# Altium footprint library CADTlink.PcbLib: 143 footprints (part 9 of 9)
Each footprint in its own frame and in the unit in brackets; x right, y up, seen from the top. Pads: shape width x height; smd on the part's side, far side on the other; paste and mask are expansions set on the pad; w line width, h text height; cw(c..) or ccw(c..) is an arc to the next point about the centre after c.
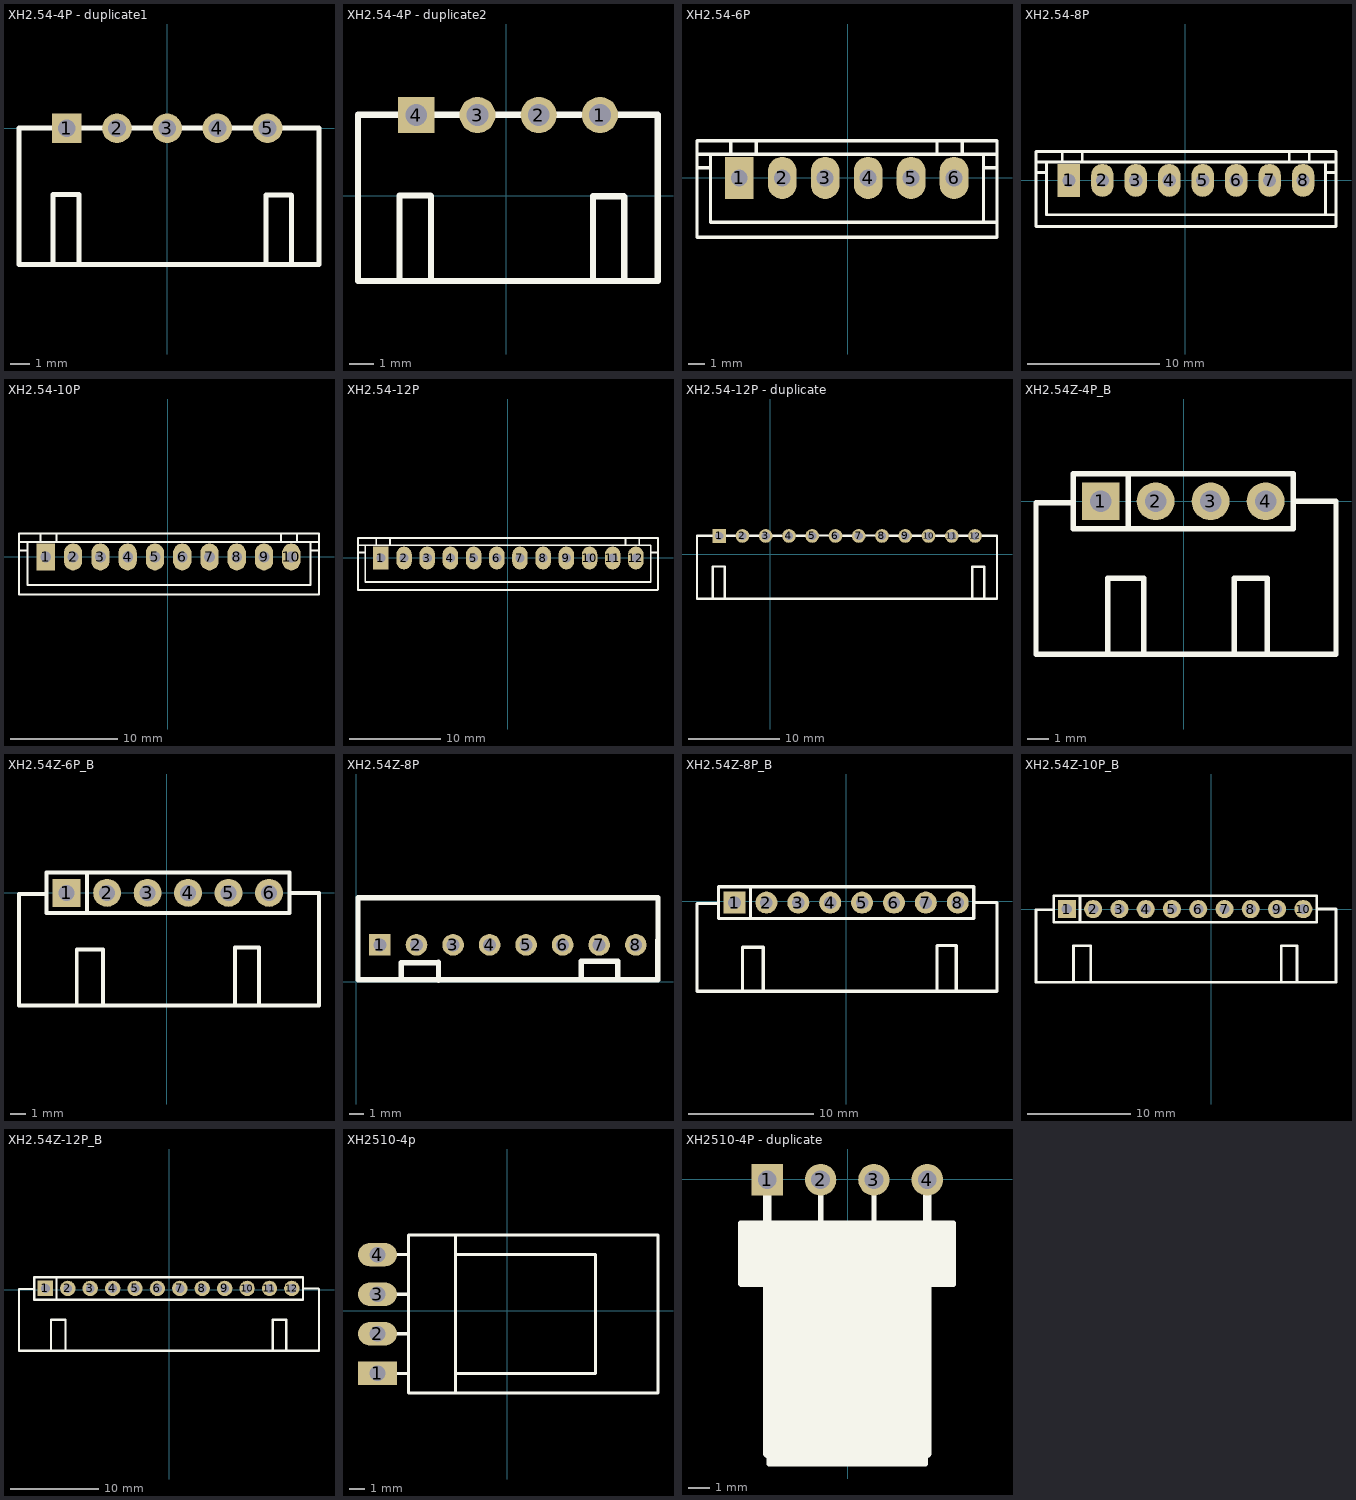
[diagram p8: the footprints below, top view; thin cyan lines are the x and y axes]

## XH2.54-4P - duplicate1 [mm]
pads (5):
  rect 1.5x1.5 hole 0.9: 1(-5.08,0)
  round 1.5 hole 0.9: 2(-2.54,0) 3(0,0) 4(2.54,0) 5(5.08,0)
Top Overlay:
  lines w0.254: -7.5,-6.88 4.993,-6.88 ; -7.492,-6.886 -7.492,0 ; -7.492,0.01 -5.778,0.01 1.732,0.01 5.915,0.01 7.683,0.01 ; -5.77,-6.81 -5.77,-3.34 -4.49,-3.34 -4.47,-3.36 -4.47,-6.75 ; 6.293,-6.78 6.293,-3.39 6.273,-3.37 4.993,-3.37 4.993,-6.88 ; 7.683,0 7.683,-6.889 4.993,-6.88
3D body: height 7, standoff -3.4, extent -7.362,-6.106 7.667,-0.356

## XH2.54-4P - duplicate2 [mm]
pads (4):
  round 1.5 hole 0.9: 1(3.892,3.353) 2(1.352,3.353) 3(-1.188,3.353)
  rect 1.5x1.5 hole 0.9: 4(-3.728,3.353)
Top Overlay:
  lines w0.254: -6.148,-3.527 6.302,-3.527 ; -6.14,-3.533 -6.14,3.353 ; -6.14,3.363 -4.426,3.363 ; -4.418,-3.457 -4.418,0.013 -3.138,0.013 -3.118,-0.007 -3.118,-3.397 ; -3.026,3.363 3.084,3.363 ; 3.602,-3.487 3.602,-0.017 4.882,-0.017 4.902,-0.037 4.902,-3.427 ; 4.524,3.363 6.292,3.363 ; 6.292,-3.536 6.292,3.353
3D body: height 8, standoff -2, extent -6.072,-2.805 6.428,2.845

## XH2.54-6P [mm]
pads (6):
  rect 1.7x2.5 hole 1 square: 1(-6.405,0)
  oval 1.7x2.5 hole 1: 2(-3.865,0) 3(-1.325,0) 4(1.215,0) 5(3.755,0) 6(6.295,0)
Top Overlay:
  lines w0.2: -8.905,0.595 -8.105,0.595 ; -8.905,1.395 8.835,1.395 ; -8.105,1.395 -8.105,-2.616 8.834,-2.616 ; -6.905,1.395 -6.905,2.184 ; -5.405,1.42 -5.405,2.184 ; 5.289,1.42 5.289,2.184 ; 6.789,1.395 6.789,2.184 ; 8.034,-2.616 8.034,1.395 ; 8.034,0.595 8.834,0.595 ; 8.834,-3.505 -8.905,-3.505 -8.905,2.195 8.819,2.195 8.819,2.159 8.834,2.159 8.834,-3.47

## XH2.54-8P [mm]
pads (8):
  rect 1.7x2.5 hole 1 square: 1(-8.85,0)
  oval 1.7x2.5 hole 1: 2(-6.31,0) 3(-3.77,0) 4(-1.23,0) 5(1.31,0) 6(3.85,0) 7(6.39,0) 8(8.93,0)
Top Overlay:
  lines w0.2: -11.35,0.595 -10.55,0.595 ; -11.35,1.395 11.429,1.395 ; -10.55,1.395 -10.55,-2.616 11.429,-2.616 ; -9.35,1.395 -9.35,2.184 ; -7.85,1.42 -7.85,2.184 ; 7.884,1.42 7.884,2.184 ; 9.384,1.395 9.384,2.184 ; 10.629,-2.616 10.629,1.395 ; 10.629,0.595 11.429,0.595 ; 11.415,2.195 11.415,2.159 11.429,2.159 11.429,-3.47 ; 11.429,-3.505 -11.35,-3.505 -11.35,2.195 11.429,2.195

## XH2.54-10P [mm]
pads (10):
  rect 1.7x2.5 hole 1 square: 1(-11.37,0)
  oval 1.7x2.5 hole 1: 2(-8.83,0) 3(-6.29,0) 4(-3.75,0) 5(-1.21,0) 6(1.33,0) 7(3.87,0) 8(6.41,0) 9(8.95,0) 10(11.49,0)
Top Overlay:
  lines w0.2: -13.87,0.595 -13.07,0.595 ; -13.87,1.395 14.07,1.395 ; -13.07,1.395 -13.07,-2.616 13.27,-2.616 13.27,1.395 ; -11.87,1.395 -11.87,2.184 ; -10.37,1.42 -10.37,2.184 ; 10.525,1.42 10.525,2.184 ; 12.025,1.395 12.025,2.184 ; 13.27,0.595 14.07,0.595 ; 14.035,-3.505 -13.87,-3.505 -13.87,2.195 14.055,2.195 14.055,2.159 14.07,2.159 14.07,-3.47

## XH2.54-12P [mm]
pads (12):
  rect 1.7x2.5 hole 1 square: 1(-13.915,-0.051)
  oval 1.7x2.5 hole 1: 2(-11.375,-0.051) 3(-8.835,-0.051) 4(-6.295,-0.051) 5(-3.755,-0.051) 6(-1.215,-0.051) 7(1.325,-0.051) 8(3.865,-0.051) 9(6.405,-0.051) 10(8.945,-0.051) 11(11.485,-0.051) 12(14.025,-0.051)
Top Overlay:
  lines w0.2: -16.415,0.544 -15.615,0.544 ; -16.415,1.344 15.63,1.344 ; -15.615,1.344 -15.615,-2.667 15.645,-2.667 15.645,1.344 ; -14.415,1.344 -14.415,2.134 ; -12.915,1.369 -12.915,2.134 ; 12.9,1.369 12.9,2.134 ; 14.4,1.344 14.4,2.134 ; 15.645,0.544 16.445,0.544 ; 16.44,2.144 -16.415,2.144 -16.415,-3.556 16.41,-3.556 16.445,-3.521 16.445,2.144

## XH2.54-12P - duplicate [mm]
pads (12):
  rect 1.5x1.5 hole 0.9: 1(-5.557,1.981)
  round 1.5 hole 0.9: 2(-3.017,1.981) 3(-0.477,1.981) 4(2.063,1.981) 5(4.603,1.981) 6(7.143,1.981) 7(9.683,1.981) 8(12.223,1.981) 9(14.763,1.981) 10(17.303,1.981) 11(19.843,1.981) 12(22.383,1.981)
Top Overlay:
  lines w0.254: -7.977,-4.899 24.765,-4.899 ; -7.969,-4.905 -7.969,1.981 ; -7.969,1.991 -6.255,1.991 ; -6.247,-4.829 -6.247,-1.359 -4.967,-1.359 -4.947,-1.379 -4.947,-4.769 ; -4.855,1.991 1.255,1.991 ; 2.695,1.991 4.463,1.991 ; 5.083,2.017 6.851,2.017 ; 7.775,1.991 9.543,1.991 ; 10.239,2.017 12.007,2.017 ; 12.855,1.991 14.623,1.991 ; 15.395,1.991 17.163,1.991 ; 17.935,1.991 19.703,1.991 ; 20.298,1.991 22.065,1.991 ; 22.093,-4.859 22.093,-1.389 23.373,-1.389 23.393,-1.409 23.393,-4.799 ; 23.015,1.991 24.783,1.991 ; 24.783,-4.907 24.783,1.981
3D body: height 5.67, standoff -3.08, extent -7.884,-5.298 24.716,2.402

## XH2.54Z-4P_B [mm]
pads (4):
  rect 1.75x1.75 hole 1: 1(-3.837,0)
  round 1.75 hole 1: 2(-1.297,0) 3(1.243,0) 4(3.783,0)
Top Overlay:
  lines w0.25: -6.826,-0.064 -5.171,-0.064 ; -3.502,-7.064 -3.502,-3.556 -1.851,-3.556 -1.851,-6.937 ; 2.339,-7.064 2.339,-3.556 3.863,-3.556 3.863,-7.064 ; 5.07,0 7.035,0
  lines w0.254: -6.826,-0.064 -6.826,-7.064 7.035,-7.064 7.035,0 ; -2.567,-1.27 -2.567,1.27 ; -5.107,-1.27 -5.107,1.27 5.07,1.27 5.07,-1.27 -5.107,-1.27
3D body: height 5.76, standoff -2.79, extent -6.225,-7.192 6.275,0.508

## XH2.54Z-6P_B [mm]
pads (6):
  rect 1.75x1.75 hole 1: 1(-6.297,0)
  round 1.75 hole 1: 2(-3.757,0) 3(-1.217,0) 4(1.323,0) 5(3.863,0) 6(6.403,0)
Top Overlay:
  lines w0.25: -9.286,-0.064 -7.631,-0.064 ; -5.662,-7.064 -5.662,-3.556 -4.011,-3.556 -4.011,-6.937 ; 4.259,-6.937 4.259,-3.429 5.783,-3.429 5.783,-6.937 ; 7.71,0 9.54,0
  lines w0.254: -9.286,-0.064 -9.286,-7.064 9.54,-7.064 9.54,0 ; -5.027,-1.27 -5.027,1.27 ; -7.567,-1.27 -7.567,1.27 7.695,1.27 7.695,-1.27 -7.567,-1.27

## XH2.54Z-8P [mm]
height 1.2
pads (8):
  rect 1.5x1.5 hole 0.9: 1(1.649,2.552)
  round 1.5 hole 0.9: 2(4.189,2.552) 3(6.729,2.552) 4(9.269,2.552) 5(11.8,2.552) 6(14.34,2.552) 7(16.88,2.552) 8(19.42,2.552)
Top Overlay:
  lines w0.381: 0.127,0.125 0.127,5.81 ; 0.149,5.809 20.9,5.812 ; 0.168,0.112 20.9,0.119 ; 3.138,0.172 3.138,1.292 ; 3.138,1.322 5.708,1.322 ; 5.718,0.102 5.718,1.332 ; 15.62,1.397 18.161,1.397 18.161,0.167 ; 15.621,0.167 15.621,1.397 ; 20.955,0.127 20.964,5.81

## XH2.54Z-8P_B [mm]
pads (8):
  rect 1.75x1.75 hole 1: 1(-8.907,-0.127)
  round 1.75 hole 1: 2(-6.367,-0.127) 3(-3.827,-0.127) 4(-1.287,-0.127) 5(1.253,-0.127) 6(3.793,-0.127) 7(6.333,-0.127) 8(8.873,-0.127)
Top Overlay:
  lines w0.25: -11.896,-0.191 -10.241,-0.191 ; -8.272,-7.191 -8.272,-3.683 -6.621,-3.683 -6.621,-7.064 ; 7.229,-7.064 7.229,-3.556 8.753,-3.556 8.753,-7.064 ; 10.155,-0.127 12,-0.127
  lines w0.254: -11.896,-0.191 -11.896,-7.191 12,-7.191 12,-0.127 ; -7.637,-1.397 -7.637,1.143 ; -10.177,-1.397 10.155,-1.397 10.155,1.143 -10.177,1.143 -10.177,-1.397

## XH2.54Z-10P_B [mm]
pads (10):
  rect 1.75x1.75 hole 1: 1(-13.962,0)
  round 1.75 hole 1: 2(-11.422,0) 3(-8.882,0) 4(-6.342,0) 5(-3.802,0) 6(-1.262,0) 7(1.278,0) 8(3.818,0) 9(6.358,0) 10(8.898,0)
Top Overlay:
  lines w0.25: -16.951,-0.064 -15.296,-0.064 ; -13.327,-7.064 -13.327,-3.556 -11.676,-3.556 -11.676,-6.937 ; 6.764,-7.064 6.764,-3.556 8.288,-3.556 8.288,-7.064 ; 10.2,0 12.06,0
  lines w0.254: -16.951,-0.064 -16.951,-7.064 12.06,-7.064 12.06,0 ; -12.692,-1.27 -12.692,1.27 ; -15.232,-1.27 10.2,-1.27 10.2,1.27 -15.232,1.27 -15.232,-1.27

## XH2.54Z-12P_B [mm]
pads (12):
  rect 1.75x1.75 hole 1: 1(-14.022,0.127)
  round 1.75 hole 1: 2(-11.482,0.127) 3(-8.942,0.127) 4(-6.402,0.127) 5(-3.862,0.127) 6(-1.322,0.127) 7(1.218,0.127) 8(3.758,0.127) 9(6.298,0.127) 10(8.838,0.127) 11(11.378,0.127) 12(13.918,0.127)
Top Overlay:
  lines w0.25: -17.011,0.063 -15.356,0.063 ; -13.387,-6.937 -13.387,-3.429 -11.736,-3.429 -11.736,-6.81 ; 11.759,-6.937 11.759,-3.429 13.283,-3.429 13.283,-6.937 ; 15.188,0.127 16.925,0.127
  lines w0.254: -17.011,0.063 -17.011,-6.937 16.989,-6.937 16.989,0.063 ; -12.752,-1.143 -12.752,1.397 ; -15.292,-1.143 -15.292,1.397 15.188,1.397 15.188,-1.143 -15.292,-1.143
3D body: height 5.67, standoff -3.08, extent -16.368,-6.898 16.233,0.802

## XH2510-4p [mm]
pads (4):
  rect 2.5x1.5 hole 1: 1(-8.343,-4.022)
  oval 2.5x1.5 hole 1: 2(-8.343,-1.482) 3(-8.343,1.058) 4(-8.343,3.598)
Top Overlay:
  lines w0.2: -8.343,-4.022 -6.343,-4.022 ; -8.343,-1.482 -6.343,-1.482 ; -8.343,1.058 -6.343,1.058 ; -8.343,3.598 -6.343,3.598 ; -3.343,-5.292 -3.343,4.868 ; -3.343,-4.022 5.657,-4.022 5.657,3.598 -3.343,3.598 ; -6.343,-5.292 -6.343,4.868 9.657,4.868 9.657,-5.292 -6.343,-5.292
3D body: height 5.89, standoff -3.51, extent -8.627,-5.049 5.853,4.631

## XH2510-4P - duplicate [mm]
pads (4):
  rect 1.5x1.5 hole 0.9: 1(-3.835,-0.025)
  round 1.5 hole 0.9: 2(-1.295,-0.025) 3(1.245,-0.025) 4(3.785,-0.025)
Top Overlay:
  lines w0.254: -3.835,-2.108 -3.835,-0.025 ; -3.785,-2.108 3.835,-2.108 3.835,-5.055 -3.734,-5.055 ; -1.295,-13.081 -1.295,-0.025 ; 1.245,-13.081 1.245,-0.025 ; 5.029,-5.004 -5.08,-5.004 -5.105,-4.978 -5.105,-2.083 5.029,-2.083 5.029,-4.978 ; -3.734,-5.055 3.683,-5.055 3.683,-13.564 -3.734,-13.564 -3.734,-5.055 ; -3.683,-10.617 -3.683,-2.108 3.734,-2.108 3.734,-10.617 -3.683,-10.617
  lines w0.4: -3.835,-13.081 -3.835,-0.025 ; 3.785,-13.081 3.785,-0.025
  lines w1: -3.353,-5.537 -1.956,-5.537 ; -3.277,-13.106 -3.277,-11.709 ; -3.226,-6.96 -3.226,-5.563 ; -2.896,-13.183 -1.499,-13.183 ; -1.321,-13.132 0.076,-13.132 ; 1.854,-13.081 3.251,-13.081 ; 1.905,-5.461 3.302,-5.461 ; 3.251,-7.01 3.251,-5.613 ; 3.277,-12.675 3.277,-11.278
  lines w1.5: -4.47,-4.369 4.369,-4.369 ; -4.445,-3.658 4.394,-3.658 ; -4.445,-2.743 4.394,-2.743
  lines w5: -1.321,-11.151 -1.321,-7.417 ; -1.321,-7.62 1.27,-7.62 ; 1.295,-11.125 1.295,-7.391
3D body: height 5.89, standoff -3.51, extent -4.871,-14.159 4.809,0.322